# Altium footprint library CONN_DSUB.PcbLib: 35 footprints (part 3 of 3)
Each footprint in its own frame and in the unit in brackets; x right, y up, seen from the top. Pads: shape width x height; smd on the part's side, far side on the other; paste and mask are expansions set on the pad; w line width, h text height; cw(c..) or ccw(c..) is an arc to the next point about the centre after c.
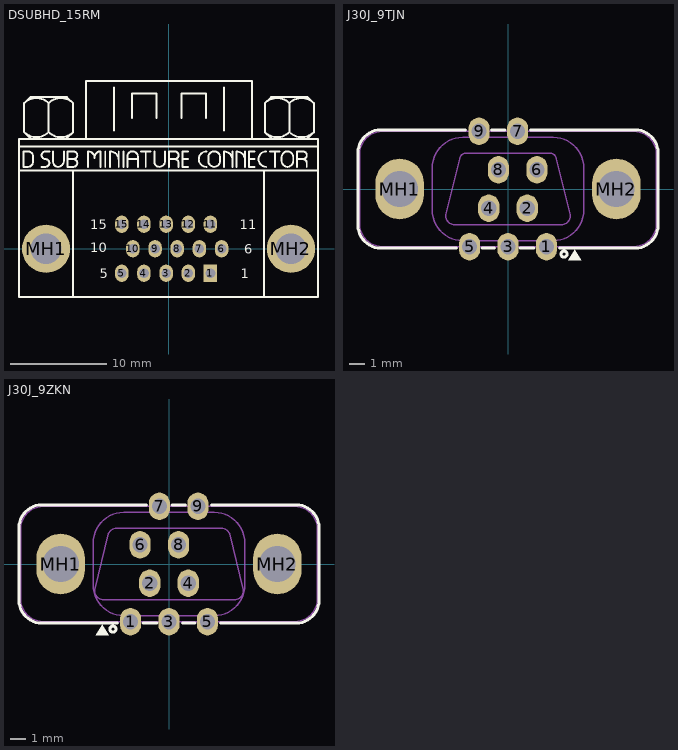
[diagram p2: the footprints below, top view; thin cyan lines are the x and y axes]

## DSUBHD_15RM [mm] "CONN, DSUB MINIATURE, HIGH DENSITY 15p, RightAngle, Male, VGA"
pads (17):
  rect 1.4x1.8 hole 1: 1(4.35,-2.54)
  oval 1.4x1.8 hole 1: 2(2.05,-2.54) 3(-0.25,-2.54) 4(-2.55,-2.54) 5(-4.85,-2.54) 6(5.5,0) 7(3.2,0) 8(0.9,0) 9(-1.4,0) 10(-3.7,0) 11(4.35,2.54) 12(2.05,2.54) 13(-0.25,2.54) 14(-2.55,2.54) 15(-4.85,2.54)
  round 5 hole 3.2: MH1(-12.7,0) MH2(12.7,0)
Top Overlay:
  lines w0.2: -15.5,8.1 15.5,8.1 ; -15.5,10.6 15.5,10.6 ; -14.983,12.104 ccw(c-13.711,13.377) -12.439,12.104 ; -14.983,15.107 cw(c-13.711,13.835) -12.439,15.107 ; -14.346,11.472 -14.981,12.107 -14.981,15.105 -14.346,15.74 -10.536,15.74 -9.901,15.105 -9.901,12.107 -10.536,11.472 ; -13.163,8.5 -12.763,8.5 ccw(c-12.763,8.9) -12.363,8.9 ccw(c-12.763,8.9) -12.763,9.3 cw(c-12.763,9.7) -13.163,9.7 cw(c-12.763,9.7) -12.763,10.1 -12.363,10.1 ; -12.443,12.104 ccw(c-11.171,13.377) -9.899,12.104 ; -12.443,15.107 cw(c-11.171,13.835) -9.899,15.107 ; -12.441,12.104 -12.441,15.105 ; -11.963,10.1 -11.963,9 ccw(c-11.463,9) -11.463,8.5 ccw(c-11.463,9.1) -10.863,9.1 -10.863,10.1 ; -10.463,9.3 -9.863,9.3 ; -9.9,-5 -9.9,8.1 ; -8.563,11.43 -8.563,17.4 8.637,17.4 8.637,11.43 ; -8.363,8.5 -8.363,10.1 cw(c-8.363,9.4) -7.663,9.4 -7.663,9.5 cw(c-7.063,9.5) -7.063,10.1 -7.063,8.5 ; -6.563,8.5 -6.563,10.1 ; -6.063,8.5 -6.063,10.1 cw(c-6.063,9.2) -5.163,9.2 ; -5.668,12.288 -5.668,16.733 ; -5.163,8.5 -5.163,9.2 ; -5.163,10.1 -5.163,9.2 ; -4.663,8.5 -4.663,10.1 ; -4.263,8.5 -4.263,9.6 cw(c-3.763,9.6) -3.763,10.1 cw(c-3.763,9.5) -3.163,9.5 -3.163,8.5 ; -4.263,9.3 -3.163,9.3 ; -3.805,13.558 -3.805,16.098 -1.265,16.098 -1.265,13.558 ; -2.863,10.1 -1.863,10.1 ; -2.413,10.1 cw(c-2.413,10.05) -2.363,10.05 -2.363,8.5 ; -1.463,10.1 -1.463,9 ccw(c-0.963,9) -0.963,8.5 ccw(c-0.963,9.1) -0.363,9.1 -0.363,10.1 ; 0.037,8.5 0.037,10.1 0.637,10.1 cw(c0.637,9.7) 1.037,9.7 cw(c0.637,9.7) 0.637,9.3 ; 0.037,9.3 0.637,9.3 ; 1.037,8.5 1.037,8.9 ccw(c0.637,8.9) 0.637,9.3 ; 1.36,13.558 1.36,16.098 3.9,16.098 3.9,13.558 ; 1.437,9.3 2.037,9.3 ; 2.037,8.5 1.437,8.5 1.437,10.1 2.037,10.1 ; 3.937,8.5 cw(c3.937,9.3) 3.137,9.3 ; 3.937,10.1 ccw(c3.937,9.3) 3.137,9.3 ; 5.737,8.5 5.737,10.1 cw(c5.737,9.2) 6.637,9.2 ; 5.762,12.288 5.762,16.733 ; 6.637,8.5 6.637,9.2 ; 6.637,10.1 6.637,9.2 ; 7.037,8.5 7.037,10.1 cw(c7.037,9.2) 7.937,9.2 ; 7.937,8.5 7.937,9.2 ; 7.937,10.1 7.937,9.2 ; 8.337,9.3 8.937,9.3 ; 8.937,8.5 8.337,8.5 8.337,10.1 8.937,10.1 ; 9.9,-5 9.9,8.1 ; 9.993,12.104 ccw(c11.266,13.377) 12.538,12.104 ; 9.993,15.107 cw(c11.266,13.835) 12.538,15.107 ; 9.996,12.104 9.996,15.105 10.631,15.74 14.441,15.74 15.076,15.105 15.076,12.068 ; 9.996,12.107 10.631,11.472 ; 10.137,8.5 cw(c10.137,9.3) 9.337,9.3 cw(c10.137,9.3) 10.137,10.1 ; 10.537,10.1 11.537,10.1 ; 11.037,8.5 11.037,10.05 ; 12.533,12.104 ccw(c13.806,13.377) 15.078,12.104 ; 12.533,15.107 cw(c13.806,13.835) 15.078,15.107 ; 12.536,12.104 12.536,15.105 ; 13.337,8.5 13.337,10.1 13.937,10.1 cw(c13.937,9.7) 14.337,9.7 cw(c13.937,9.7) 13.937,9.3 ; 13.337,9.3 13.937,9.3 ; 14.337,8.5 14.337,8.9 ccw(c13.937,8.9) 13.937,9.3 ; 14.441,11.472 15.076,12.107 ; -9.863,9.3 ccw(c-9.863,9.7) -9.463,9.7 ccw(c-9.863,9.7) -9.863,10.1 -10.463,10.1 -10.463,8.5 -9.863,8.5 ccw(c-9.863,8.9) -9.463,8.9 ccw(c-9.863,8.9) -9.863,9.3 ; 3.137,9.3 3.137,9.3 ; -15.5,-5 -15.5,11.4 15.5,11.4 15.5,-5 -15.5,-5 ; -15.063,8.5 -14.563,8.5 ccw(c-14.563,9) -14.063,9 -14.063,9.6 ccw(c-14.563,9.6) -14.563,10.1 -15.063,10.1 -15.063,8.5 ; 4.137,9.1 ccw(c4.737,9.1) 4.737,8.5 ccw(c4.737,9.1) 5.337,9.1 5.337,9.5 ccw(c4.737,9.5) 4.737,10.1 ccw(c4.737,9.5) 4.137,9.5 4.137,9.1 ; 11.737,9.1 ccw(c12.337,9.1) 12.337,8.5 ccw(c12.337,9.1) 12.937,9.1 12.937,9.5 ccw(c12.337,9.5) 12.337,10.1 ccw(c12.337,9.5) 11.737,9.5 11.737,9.1
  text "15" at -8.128,2.032 h1
  text "6" at 7.874,-0.508 h1
  text "5" at -7.112,-3.048 h1
  text "10" at -8.128,-0.381 h1
  text "11" at 7.366,2.032 h1
  text "1" at 7.493,-3.048 h1
3D body "SDH15P-RA-PC.step": height 12.77, standoff -3.37, extent -15.405,-4.82 15.405,17.394

## J30J_9TJN [mm] "J30J-9TJN ANOVAY"
pads (11):
  oval 1.4x1.8 hole 1: 1(2.54,-3.81) 2(1.27,-1.27) 3(0,-3.81) 4(-1.27,-1.27) 5(-2.54,-3.81) 6(1.905,1.27) 7(0.635,3.81) 8(-0.635,1.27) 9(-1.905,3.81)
  oval 3.2x4 hole 2.4: MH1(-7.15,0) MH2(7.15,0)
Top Overlay:
  circle w0.2: c3.7,-4.3 r0.2
  region: 3.98,-4.7 4.82,-4.7 4.4,-4
  lines w0.2: -3.4,-3.9 -8.4,-3.9 cw(c-8.4,-2.4) -9.9,-2.4 -9.9,2.4 cw(c-8.4,2.4) -8.4,3.9 -2.8,3.9 ; -1.7,-3.9 -0.9,-3.9 ; -1.1,3.9 -0.2,3.9 ; 0.8,-3.9 1.7,-3.9 ; 1.5,3.9 8.4,3.9 cw(c8.4,2.4) 9.9,2.4 9.9,-2.4 cw(c8.4,-2.4) 8.4,-3.9 3.4,-3.9
Mechanical 1:
  lines w0.1: -9.8,-2.3 ccw(c-8.3,-2.3) -8.3,-3.8 8.3,-3.8 ccw(c8.3,-2.3) 9.8,-2.3 9.8,2.3 ccw(c8.3,2.3) 8.3,3.8 -8.3,3.8 ccw(c-8.3,2.3) -9.8,2.3 -9.8,-2.3 ; -5,-1.4 ccw(c-3,-1.4) -3,-3.4 3,-3.4 ccw(c3,-1.4) 5,-1.4 5,1.4 ccw(c3,1.4) 3,3.4 -3,3.4 ccw(c-3,1.4) -5,1.4 -5,-1.4 ; -4.1,-1.7 ccw(c-3.525,-1.775) -3.6,-2.35 3.6,-2.35 ccw(c3.525,-1.775) 4.1,-1.7 3.2,2 ccw(c2.8,1.95) 2.75,2.35 -2.75,2.35 ccw(c-2.8,1.95) -3.2,2 -4.1,-1.7
3D body: height 9.2, standoff 0, extent 5.55,-1.599 8.75,1.599
3D body: height 16.2, standoff 11.6, extent -4,-2.25 4,2.25
3D body: height 16.2, standoff 5.7, extent 1.607,0.336 2.205,0.935
3D body: height 16.2, standoff 5.7, extent 0.337,0.336 0.935,0.935
3D body: height 16.2, standoff 5.7, extent -2.203,0.336 -1.605,0.935
3D body: height 16.2, standoff 5.7, extent -0.933,0.336 -0.335,0.935
3D body: height 16.2, standoff 5.7, extent 2.239,-0.934 2.837,-0.335
3D body: height 16.2, standoff 5.7, extent 0.97,-0.934 1.567,-0.336
3D body: height 16.2, standoff 5.7, extent -2.837,-0.934 -2.24,-0.335
3D body: height 16.2, standoff 5.7, extent -1.567,-0.934 -0.97,-0.335
3D body: height 9.2, standoff 5.7, extent -5,-3.4 5,3.4
3D body: height 16.2, standoff 5.7, extent -0.298,-0.934 0.3,-0.336
3D body: height 11.6, standoff 9.2, extent -9.8,-3.8 9.8,3.8
3D body: height 16.2, standoff 11.6, extent -4.122,-2.351 4.1,2.35
3D body: height 16.2, standoff 11.6, extent 5.55,-1.725 8.75,1.725
3D body: height 16.2, standoff 11.6, extent -8.75,-1.725 -5.55,1.725
3D body: height 9.2, standoff 0, extent -8.75,-1.599 -5.55,1.599

## J30J_9ZKN [mm] "J30J-9ZKN ANOVAY"
pads (11):
  oval 1.4x1.8 hole 1: 1(-2.54,-3.81) 2(-1.27,-1.27) 3(0,-3.81) 4(1.27,-1.27) 5(2.54,-3.81) 6(-1.905,1.27) 7(-0.635,3.81) 8(0.635,1.27) 9(1.905,3.81)
  oval 3.2x4 hole 2.4: MH1(-7.15,0) MH2(7.15,0)
Top Overlay:
  circle w0.2: c-3.7,-4.3 r0.2
  region: -3.98,-4.7 -4.82,-4.7 -4.4,-4
  lines w0.2: -3.4,-3.9 -8.4,-3.9 cw(c-8.4,-2.4) -9.9,-2.4 -9.9,2.4 cw(c-8.4,2.4) -8.4,3.9 -1.5,3.9 ; -1.7,-3.9 -0.8,-3.9 ; 0.2,3.9 1.1,3.9 ; 0.9,-3.9 1.7,-3.9 ; 2.8,3.9 8.4,3.9 cw(c8.4,2.4) 9.9,2.4 9.9,-2.4 cw(c8.4,-2.4) 8.4,-3.9 3.4,-3.9
Mechanical 1:
  lines w0.1: -9.8,-2.3 ccw(c-8.3,-2.3) -8.3,-3.8 8.3,-3.8 ccw(c8.3,-2.3) 9.8,-2.3 9.8,2.3 ccw(c8.3,2.3) 8.3,3.8 -8.3,3.8 ccw(c-8.3,2.3) -9.8,2.3 -9.8,-2.3 ; -5,-1.4 ccw(c-3,-1.4) -3,-3.4 3,-3.4 ccw(c3,-1.4) 5,-1.4 5,1.4 ccw(c3,1.4) 3,3.4 -3,3.4 ccw(c-3,1.4) -5,1.4 -5,-1.4 ; -4.9,-1.7 ccw(c-4.325,-1.775) -4.4,-2.35 4.4,-2.35 ccw(c4.325,-1.775) 4.9,-1.7 4,2 ccw(c3.466,1.778) 3.55,2.35 -3.55,2.35 ccw(c-3.466,1.778) -4,2 -4.9,-1.7
3D body: height 9.2, standoff 0, extent 5.55,-1.599 8.75,1.599
3D body: height 16.2, standoff 11.6, extent 5.55,-1.725 8.75,1.725
3D body: height 9.2, standoff 0, extent -8.75,-1.599 -5.55,1.599
3D body: height 16.2, standoff 11.6, extent -8.75,-1.725 -5.55,1.725
3D body: height 16.2, standoff 5.7, extent -2.986,-1.08 -2.09,-0.185
3D body: height 16.2, standoff 5.7, extent -2.351,0.19 -1.455,1.084
3D body: height 16.2, standoff 5.7, extent -1.716,-1.08 -0.82,-0.186
3D body: height 16.2, standoff 5.7, extent -1.081,0.19 -0.185,1.084
3D body: height 16.2, standoff 5.7, extent 0.189,0.19 1.085,1.084
3D body: height 16.2, standoff 5.7, extent 1.459,0.19 2.355,1.084
3D body: height 16.2, standoff 5.7, extent 2.093,-1.08 2.989,-0.185
3D body: height 16.2, standoff 5.7, extent 0.823,-1.08 1.72,-0.186
3D body: height 16.2, standoff 5.7, extent -0.446,-1.08 0.45,-0.186
3D body: height 11.6, standoff 9.2, extent -9.789,-3.799 9.811,3.801
3D body: height 9.2, standoff 5.7, extent -4.989,-3.399 5.011,3.401
3D body: height 16.2, standoff 11.6, extent -4.9,-2.35 4.9,2.35